# Altium footprint library FOOTPRINTS_tracker.PcbLib: 29 footprints (part 1 of 2)
Each footprint in its own frame and in the unit in brackets; x right, y up, seen from the top. Pads: shape width x height; smd on the part's side, far side on the other; paste and mask are expansions set on the pad; w line width, h text height; cw(c..) or ccw(c..) is an arc to the next point about the centre after c.
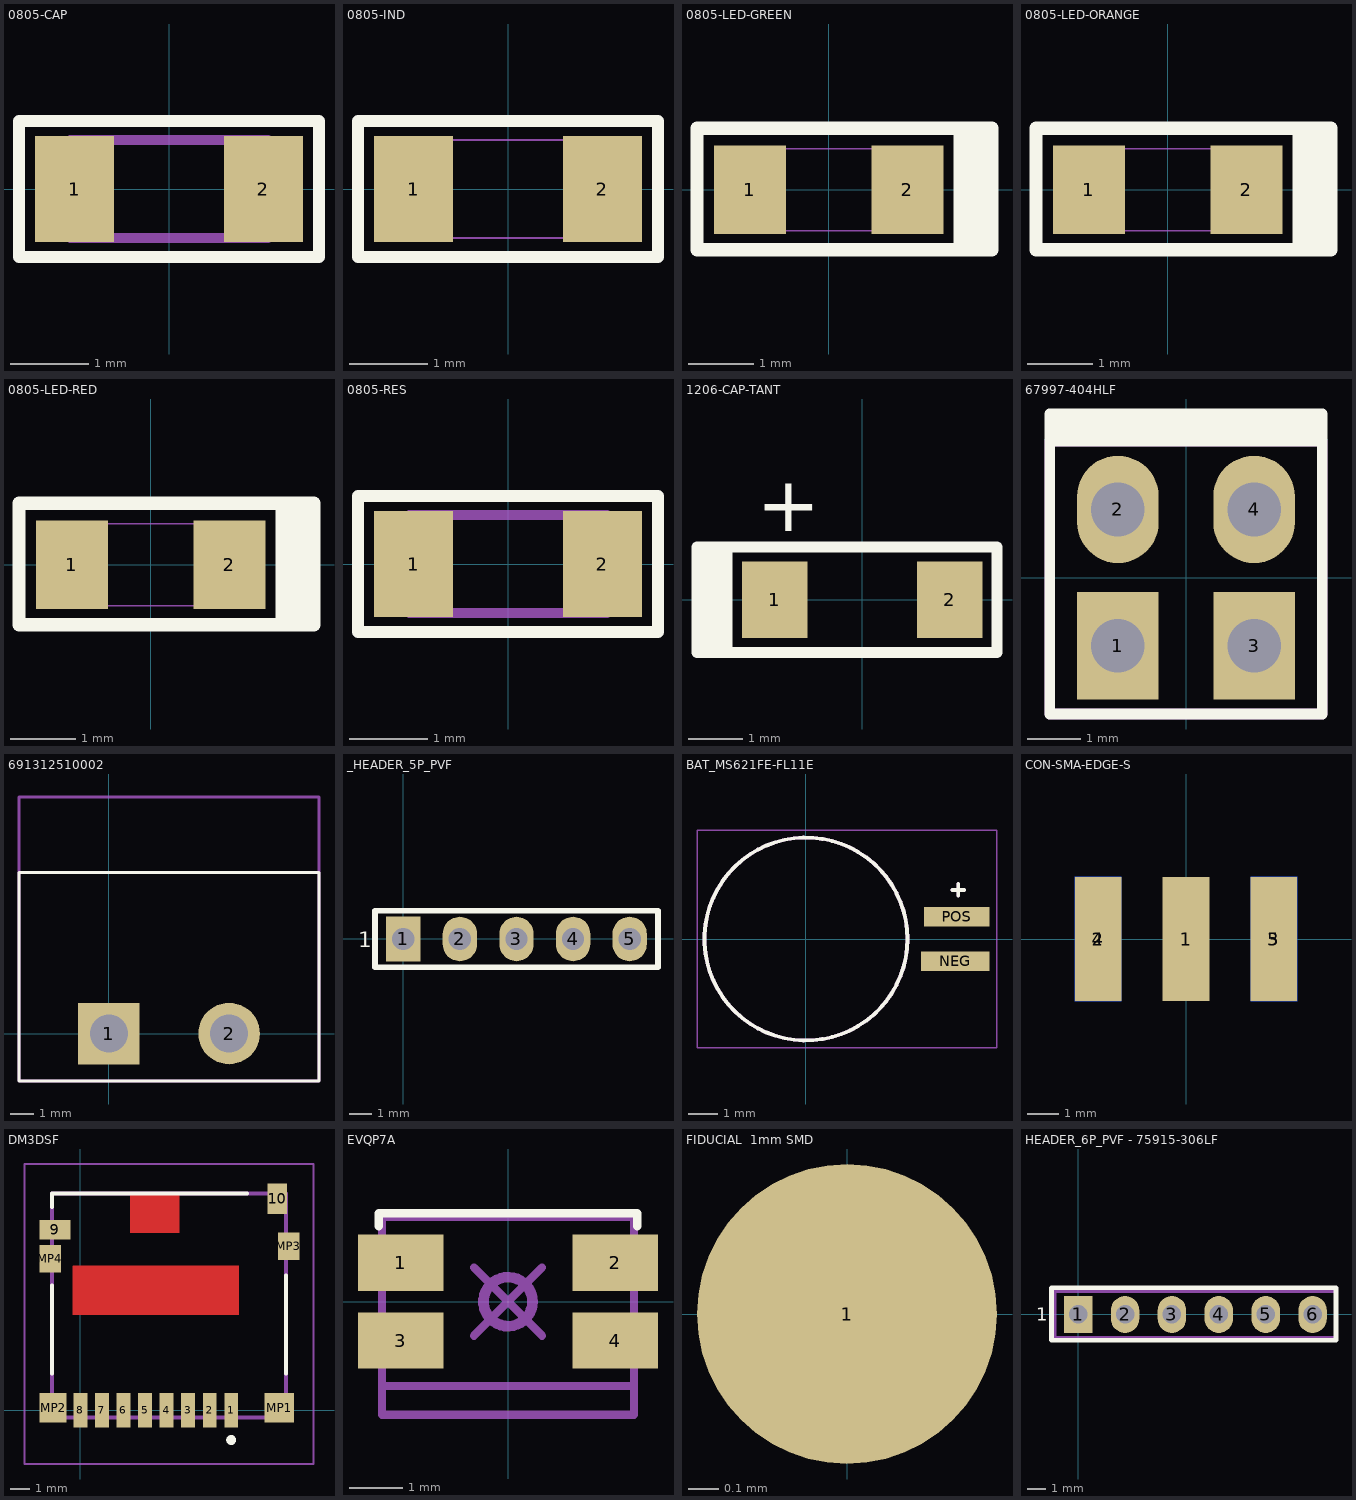
[diagram p0: the footprints below, top view; thin cyan lines are the x and y axes]

## 0805-CAP [mm]
height 0.5
pads (2):
  rect 1x1.35 smd paste-0.03 mask+0.07: 1(-1.2,0) 2(1.2,0)
Top Overlay:
  lines w0.152: -1.905,-0.864 1.905,-0.864 1.905,0.864 -1.905,0.864 -1.905,-0.864
Mechanical 1:
  lines w0.127: -1.254,-0.625 1.254,-0.625 ; -1.254,-0.625 -1.254,0.625 ; -1.254,-0.625 1.254,-0.625 ; -1.254,-0.625 -1.254,0.625 ; -1.254,0.625 1.254,0.625 1.254,-0.625 ; -1.254,0.625 1.252,0.625 1.254,0.622 1.254,-0.625
Top Designator:
  lines w0.127: -1.254,-0.625 1.254,-0.625 ; -1.254,-0.625 1.254,-0.625 ; -1.254,-0.625 -1.254,0.625 ; -1.254,-0.625 -1.254,0.625 ; -1.254,0.625 1.254,0.625 1.254,-0.625 ; -1.254,0.625 1.252,0.625 1.254,0.622 1.254,-0.625
  text ".Designator" at -7.617,-0.508 h1.52
3D body "User Library-0805(2012M) Cap.step": height 0.79, standoff 0, extent -1.254,-0.622 1.254,0.622

## 0805-IND [mm]
height 0.5
pads (2):
  rect 1x1.35 smd paste-0.03 mask+0.07: 1(-1.2,0) 2(1.2,0)
Top Overlay:
  lines w0.152: -1.905,-0.864 1.905,-0.864 1.905,0.864 -1.905,0.864 -1.905,-0.864
Mechanical 1:
  lines w0.025: -1.254,-0.625 -1.254,0.625 1.254,0.625 1.254,-0.625 -1.254,-0.625
Top Designator:
  lines w0.025: -1.254,-0.625 1.254,-0.625 1.254,0.625 -1.254,0.625 -1.254,-0.625
  text ".Designator" at -1.113,-0.511 h0.61
3D body "User Library-Chip Inductor (3).step": height 0.95, standoff 0, extent -1,-0.6 1,0.6

## 0805-LED-GREEN [mm]
pads (2):
  rect 1.1x1.35 smd paste-0.03 mask+0.07: 1(-1.2,0) 2(1.2,0)
Top Overlay:
  rectangle: 1.905,-0.914 2.565,0.94
  lines w0.203: -2.007,-0.914 2.489,-0.914 2.489,0.94 -2.007,0.94 -2.007,-0.914
Mechanical 1:
  lines w0.025: -1.254,-0.625 1.254,-0.625 1.254,0.625 -1.254,0.625 -1.254,-0.625
  lines w0.127: -1.031,-0.456 -1.031,0.45 ; 1.031,-0.456 1.031,0.45
Top Designator:
  text ".Designator" at 2.242,-0.914 h1.52
3D body "led_0805_GREEN.step": height 1.1, standoff 0, extent -1.003,-0.625 1.017,0.625

## 0805-LED-ORANGE [mm]
pads (2):
  rect 1.1x1.35 smd paste-0.03 mask+0.07: 1(-1.2,0) 2(1.2,0)
Top Overlay:
  rectangle: 1.905,-0.914 2.565,0.94
  lines w0.203: -2.007,-0.914 2.489,-0.914 2.489,0.94 -2.007,0.94 -2.007,-0.914
Mechanical 1:
  lines w0.025: -1.254,-0.625 1.254,-0.625 1.254,0.625 -1.254,0.625 -1.254,-0.625
  lines w0.127: -1.031,-0.456 -1.031,0.45 ; 1.031,-0.456 1.031,0.45
Top Designator:
  text ".Designator" at -7.292,-0.508 h1.52
3D body "led_0805_ORANGE.step": height 1.1, standoff 0, extent -1.003,-0.625 1.017,0.625

## 0805-LED-RED [mm]
pads (2):
  rect 1.1x1.35 smd paste-0.03 mask+0.07: 1(-1.2,0) 2(1.2,0)
Top Overlay:
  rectangle: 1.905,-0.914 2.565,0.94
  lines w0.203: -2.007,-0.914 -2.007,0.94 2.489,0.94 2.489,-0.914 -2.007,-0.914
Mechanical 1:
  lines w0.025: -1.254,-0.625 -1.254,0.625 1.254,0.625 1.254,-0.625 -1.254,-0.625
  lines w0.127: -1.031,-0.456 -1.031,0.45 ; 1.031,-0.456 1.031,0.45
Top Designator:
  text ".Designator" at -7.201,-0.513 h1.52
3D body "everlight-17-21-0805LED-red.STEP": height 0.8, standoff -0.31, extent -1,-0.625 1,0.625

## 0805-RES [mm]
height 0.5
pads (2):
  rect 1x1.35 smd paste-0.03 mask+0.07: 1(-1.2,0) 2(1.2,0)
Top Overlay:
  lines w0.152: -1.905,-0.864 -1.905,0.864 1.905,0.864 1.905,-0.864 -1.905,-0.864
Mechanical 1:
  lines w0.025: -1.254,-0.622 -1.254,0.628 ; -1.254,-0.622 1.254,-0.622 ; -1.254,-0.622 -1.254,0.628 ; -1.254,-0.622 1.254,-0.622 ; -1.254,0.628 1.254,0.628 ; -1.254,0.628 1.254,0.628 ; 1.254,-0.622 1.254,0.628 ; 1.254,-0.622 1.254,0.628
Top Designator:
  lines w0.127: -1.254,-0.625 -1.254,0.625 ; -1.254,-0.625 1.254,-0.625 ; -1.254,-0.625 1.254,-0.625 ; -1.254,-0.625 -1.254,0.625 ; -1.254,0.625 1.254,0.625 ; -1.254,0.625 1.254,0.625 ; 1.254,-0.625 1.254,0.625 ; 1.254,-0.625 1.254,0.625
  text ".Designator" at -1.079,-0.496 h0.61
3D body "User Library-0805(2012M) Res.step": height 0.79, standoff 0, extent -1.254,-0.622 1.254,0.622

## 1206-CAP-TANT [mm]
pads (2):
  rect 1.2x1.4 smd paste-0.03 mask+0.07: 1(-1.6,0) 2(1.6,0)
Top Overlay:
  rectangle: -3.023,-0.965 -2.472,0.965
  lines w0.203: -2.472,-0.965 -2.472,0.965 ; -2.472,-0.965 -3.023,-0.965 -3.023,0.965 -2.472,0.965 ; -2.472,-0.965 -2.472,0.965 ; -2.472,-0.965 2.464,-0.965 2.464,0.965 -2.472,0.965
  text "+" at -1.93,1.253 h1.02
Top Designator:
  text ".Designator" at -7.721,-0.533 h1.52
3D body "SW3dPS-cap3216h160.STEP": height 1.6, standoff 0, extent -1.602,-0.825 1.598,0.775

## 67997-404HLF [mm]
pads (4):
  rect 1.524x2 hole 1: 1(-1.27,-1.27) 3(1.27,-1.27)
  oval 1.524x2 hole 1: 2(-1.27,1.27) 4(1.27,1.27)
Top Overlay:
  rectangle: -2.54,2.54 2.54,3.048
  lines w0.2: -2.54,2.54 2.54,2.54 ; -2.54,-2.54 -2.54,3.048 2.54,3.048 2.54,-2.54 -2.54,-2.54
Mechanical 1:
  lines w0.2: -2.54,-2.54 2.54,-2.54 2.54,2.54 -2.54,2.54 -2.54,-2.54
Top Designator:
  text ".Designator" at -7.681,-0.571 h1.52
3D body "User Library-HEADER 2x1 Pitch 2_54x2_54.step": height 8.38, standoff -2.92, extent 0,-2.54 2.54,2.54
3D body "User Library-HEADER 2x1 Pitch 2_54x2_54.step": height 8.38, standoff -2.92, extent -2.54,-2.54 0,2.54

## 691312510002 [mm] "Pluggable Terminal Blocks WR-TBL 300VAC 20A 2P Right Angle (Female PN: 691351500002)"
pads (2):
  rect 2.6x2.6 hole 1.6: 1(0,0)
  round 2.6 hole 1.6: 2(5.08,0)
Top Overlay:
  lines w0.127: -3.8,-2 8.88,-2 8.88,6.8 -3.8,6.8 -3.8,-2
Mechanical 1:
  lines w0.127: -3.8,-2 8.88,-2 8.88,9.99 -3.8,9.99 -3.8,-2
Top Designator:
  text ".Designator" at -3.808,3.487 h1.52
3D body "691312510002 (rev1).stp": height 8.51, standoff -3.49, extent -2.54,-2 7.62,10

## _HEADER_5P_PVF [mm] "CONN PTH 5POS PITCH 100 MILS VERTICAL FEMALE"
pads (5):
  rect 1.54x2 hole 1: 1(0,0)
  oval 1.54x2 hole 1: 2(2.54,0) 3(5.08,0) 4(7.62,0) 5(10.16,0)
Top Overlay:
  lines w0.254: -1.27,-1.27 11.43,-1.27 11.43,0.737 11.43,1.27 -1.27,1.27 -1.27,-1.27
  text "1" at -2.032,-0.381 h0.71
Mechanical 1:
  lines w0.2: -1.27,-1.27 11.43,-1.27 11.43,1.27 -1.27,1.27 -1.27,-1.27
Top Designator:
  text ".Designator" at -1.655,-1.32 h1.52
3D body "75915-305LF.stp": height 8.51, standoff -3.05, extent -1.23,-1.25 11.39,1.25

## BAT_MS621FE-FL11E [mm]
height 2.8
pads (2):
  rect 2.3x0.65 smd: NEG(5,-0.75)
  rect 2.2x0.65 smd: POS(5.05,0.75)
Top Overlay:
  circle w0.127: c0,0 r3.4
  lines w0.127: 4.9,1.646 5.3,1.646 ; 5.1,1.446 5.1,1.846
Mechanical 13:
  circle w0.127: c0,0 r3.4
  lines w0.127: 4.9,1.646 5.3,1.646 ; 5.1,1.446 5.1,1.846
Mechanical 15:
  lines w0.05: -3.65,-3.65 6.4,-3.65 6.4,3.65 -3.65,3.65 -3.65,-3.65
3D body "step_temp.STEP": height 2.8, standoff 0, extent -3.4,-3.4 5.9,3.4

## CON-SMA-EDGE-S [mm] "Connectores RF / Connectores Coaxiais SMA Female PCB Edge Mount"
pads (5):
  rect 1.5x4 smd: 1(0,0) 2(-2.825,0) 3(2.82,0)
  rect 1.5x4 smd far side: 4(-2.825,0) 5(2.825,0)
3D body "CON-SMA-EDGE-S.stp": height 3.56, standoff -2.79, extent -3.175,-1.703 3.175,11.627

## DM3DSF [mm]
pads (14):
  rect 0.7x1.75 smd: 1(7.7,0) 2(6.6,0) 3(5.5,0) 4(4.4,0) 5(3.3,0) 6(2.2,0) 7(1.1,0) 8(0,0)
  rect 1.6x1 smd: 9(-1.3,9.225)
  rect 1x1.55 smd: 10(10.05,10.8)
  rect 1.5x1.5 smd: MP1(10.15,0.125)
  rect 1.4x1.5 smd: MP2(-1.4,0.125)
  rect 1.1x1.4 smd: MP3(10.65,8.375) MP4(-1.55,7.725)
Top Layer:
  pour cut-out: 2.55,9.075 5.05,9.075 5.05,11.075 2.55,11.075
  pour cut-out: -0.4,4.875 8.1,4.875 8.1,7.375 -0.4,7.375
Top Overlay:
  lines w0.203: -1.45,1.875 -1.45,6.375 ; -1.45,10.375 -1.45,11.075 8.5,11.075 ; 10.5,1.875 10.5,6.875
  lines w0.254: 7.7,-1.651 cw(c7.7,-1.524) 7.7,-1.397 cw(c7.7,-1.524) 7.7,-1.651
Mechanical 15:
  lines w0.2: -1.45,-0.375 10.5,-0.375 10.5,11.075 -1.45,11.075 -1.45,-0.375
Mechanical 20:
  lines w0.1: -2.85,-2.75 11.9,-2.75 11.9,12.575 -2.85,12.575 -2.85,-2.75
3D body "DM3D-SF.stp": height 1.55, standoff 0, extent -1.45,-0.375 10.5,11.075

## EVQP7A [mm]
pads (4):
  rect 1.6x1.05 smd paste-0.03 mask+0.07: 1(-2,0.725) 2(2,0.725) 3(-2,-0.725) 4(2,-0.725)
Top Overlay:
  lines w0.152: -2.413,1.409 -2.413,1.651 2.413,1.651 2.413,1.409
Mechanical 1:
  lines w0.152: -2.35,-1.575 2.35,-1.575 ; -2.35,-2.112 2.35,-2.112 2.35,1.583 -2.35,1.583 -2.35,-2.112
Mechanical 3:
  circle w0.2: c0,0 r0.457
  lines w0.152: -0.635,-0.635 0.635,0.635 ; -0.635,0.635 0.635,-0.635
Top Designator:
  lines w0.152: -2.35,-2.112 2.35,-2.112 2.35,1.583 -2.35,1.583 -2.35,-2.112
  text ".Designator" at -6.828,-0.738 h1.52
3D body "User Library-EVQP7-LC-01P (2).step": height 1.35, standoff -0.5, extent -2.35,-2.112 2.35,1.583

## FIDUCIAL  1mm SMD [mm]
pads (1):
  round 1 smd paste-1 mask+1: 1(0,0)
Top Designator:
  text ".Designator" at -7.618,-0.508 h1.52

## HEADER_6P_PVF - 75915-306LF [mm] "Board to Board & Mezzanine Connectors 6P VRT SR RECEPT .76 GOLD"
pads (6):
  rect 1.54x2 hole 1: 1(0,0)
  oval 1.54x2 hole 1: 2(2.54,0) 3(5.08,0) 4(7.62,0) 5(10.16,0) 6(12.7,0)
Top Overlay:
  lines w0.254: -1.448,-1.397 -1.448,1.448 13.97,1.448 13.97,-1.397 -1.448,-1.397
  text "1" at -2.286,-0.33 h0.71
Mechanical 1:
  lines w0.2: -1.27,-1.27 -1.27,1.27 13.97,1.27 13.97,-1.27 -1.27,-1.27
Top Designator:
  text ".Designator" at -1.401,-0.559 h1.52
3D body "female_header_a-bl254-eg-g06d.stp": height 8.5, standoff -3.2, extent -1.395,-1.25 14.095,1.25